# Altium schematic symbol library jlcpcb_2025_04_capacitors_extended_1206.schlib: 2503 symbols (part 2 of 14) (continued)
## 1206B334K101CT
designator C?  Capacitance: 330nF  (hidden comment: *)
Capacitor, Ceramic (MLCC), 330nF, ±10%, 100V, X7R, ±10%, SMD 1206; Manufacturer: Walsin Tech Corp; Manufacturer Part Number: 1206B334K101CT; Package Size: 1206; JLCPCB Basic Part: No; JLCPCB Part Number: C2909452; Supplier 1: LCSC; Category: Capacitors - MLCC; Supplier Part Number 1: C2909452; Tolerance: ±10%; Voltage Rating: 100V; Temperature Coefficient: X7R; RoHS: Yes; ComponentLink1Description: Datasheet; ComponentLink1URL: https://wmsc.lcsc.com/wmsc/upload/file/pdf/v2/lcsc/2110272130_Walsin-Tech-Corp-1206B334K101CT_C2909452.pdf; ComponentLink2Description: JLCPCB Part URL; ComponentLink2URL: https://jlcpcb.com/partdetail/C2909452; ComponentLink3Description: LCSC Part URL; ComponentLink3URL: https://lcsc.com/product-detail/Multilayer-Ceramic-Capacitors-MLCC---SMD-SMT_Walsin-Tech-Corp-Walsin-Tech-Corp-1206B334K101CT_C2909452.html
footprint CAP-1206 (1206 (3216M) Capacitor)
pins: 1, 2

## 1206B334K250CT
designator C?  Capacitance: 330nF  (hidden comment: *)
Capacitor, Ceramic (MLCC), 330nF, ±10%, 25V, X7R, ±10%, SMD 1206; Manufacturer: Walsin Tech Corp; Manufacturer Part Number: 1206B334K250CT; Package Size: 1206; JLCPCB Basic Part: No; JLCPCB Part Number: C458939; Supplier 1: LCSC; Category: Capacitors - MLCC; Supplier Part Number 1: C458939; Tolerance: ±10%; Voltage Rating: 25V; Temperature Coefficient: X7R; RoHS: Yes; ComponentLink1Description: Datasheet; ComponentLink1URL: https://wmsc.lcsc.com/wmsc/upload/file/pdf/v2/lcsc/2304140030_Walsin-Tech-Corp-1206B334K250CT_C458939.pdf; ComponentLink2Description: JLCPCB Part URL; ComponentLink2URL: https://jlcpcb.com/partdetail/C458939; ComponentLink3Description: LCSC Part URL; ComponentLink3URL: https://lcsc.com/product-detail/Multilayer-Ceramic-Capacitors-MLCC---SMD-SMT_Walsin-Tech-Corp-Walsin-Tech-Corp-1206B334K250CT_C458939.html
footprint CAP-1206 (1206 (3216M) Capacitor)
pins: 1, 2

## 1206B334K250NT
designator C?  Capacitance: 330nF  (hidden comment: *)
Capacitor, Ceramic (MLCC), 330nF, 25V, SMD 1206; Manufacturer: FH(Guangdong Fenghua Advanced Tech); Manufacturer Part Number: 1206B334K250NT; Package Size: 1206; JLCPCB Basic Part: No; JLCPCB Part Number: C2762228; Supplier 1: LCSC; Category: Capacitors - MLCC; Supplier Part Number 1: C2762228; Voltage Rating: 25V; RoHS: Yes; ComponentLink1Description: Datasheet; ComponentLink1URL: https://wmsc.lcsc.com/wmsc/upload/file/pdf/v2/lcsc/2304140030_FH--Guangdong-Fenghua-Advanced-Tech-1206B334K250NT_C2762228.pdf; ComponentLink2Description: JLCPCB Part URL; ComponentLink2URL: https://jlcpcb.com/partdetail/C2762228; ComponentLink3Description: LCSC Part URL; ComponentLink3URL: https://lcsc.com/product-detail/Multilayer-Ceramic-Capacitors-MLCC---SMD-SMT_FH-Guangdong-Fenghua-Advanced-Tech-FH-Guangdong-Fenghua-Advanced-Tech-1206B334K250NT_C2762228.html
footprint CAP-1206 (1206 (3216M) Capacitor)
pins: 1, 2

## 1206B334K500CT
designator C?  Capacitance: 330nF  (hidden comment: *)
Capacitor, Ceramic (MLCC), 330nF, ±10%, 50V, X7R, ±10%, SMD 1206; Manufacturer: Walsin Tech Corp; Manufacturer Part Number: 1206B334K500CT; Package Size: 1206; JLCPCB Basic Part: No; JLCPCB Part Number: C152830; Supplier 1: LCSC; Category: Capacitors - MLCC; Supplier Part Number 1: C152830; Tolerance: ±10%; Voltage Rating: 50V; Temperature Coefficient: X7R; RoHS: Yes; ComponentLink1Description: Datasheet; ComponentLink1URL: https://wmsc.lcsc.com/wmsc/upload/file/pdf/v2/lcsc/2304140030_Walsin-Tech-Corp-1206B334K500CT_C152830.pdf; ComponentLink2Description: JLCPCB Part URL; ComponentLink2URL: https://jlcpcb.com/partdetail/C152830; ComponentLink3Description: LCSC Part URL; ComponentLink3URL: https://lcsc.com/product-detail/Multilayer-Ceramic-Capacitors-MLCC---SMD-SMT_Walsin-Tech-Corp-Walsin-Tech-Corp-1206B334K500CT_C152830.html
footprint CAP-1206 (1206 (3216M) Capacitor)
pins: 1, 2

## 1206B334K500NT
designator C?  Capacitance: 330nF  (hidden comment: *)
Capacitor, Ceramic (MLCC), 330nF, ±10%, 50V, X7R, ±10%, SMD 1206; Manufacturer: FH(Guangdong Fenghua Advanced Tech); Manufacturer Part Number: 1206B334K500NT; Package Size: 1206; JLCPCB Basic Part: No; JLCPCB Part Number: C1865; Supplier 1: LCSC; Category: Capacitors - MLCC; Supplier Part Number 1: C1865; Tolerance: ±10%; Voltage Rating: 50V; Temperature Coefficient: X7R; RoHS: Yes; ComponentLink1Description: Datasheet; ComponentLink1URL: https://wmsc.lcsc.com/wmsc/upload/file/pdf/v2/lcsc/2304140030_FH--Guangdong-Fenghua-Advanced-Tech-1206B334K500NT_C1865.pdf; ComponentLink2Description: JLCPCB Part URL; ComponentLink2URL: https://jlcpcb.com/partdetail/C1865; ComponentLink3Description: LCSC Part URL; ComponentLink3URL: https://lcsc.com/product-detail/Multilayer-Ceramic-Capacitors-MLCC---SMD-SMT_FH-Guangdong-Fenghua-Advanced-Tech-FH-Guangdong-Fenghua-Advanced-Tech-1206B334K500NT_C1865.html
footprint CAP-1206 (1206 (3216M) Capacitor)
pins: 1, 2

## 1206B335K250CT
designator C?  Capacitance: 3.3uF  (hidden comment: *)
Capacitor, Ceramic (MLCC), 3.3uF, ±10%, 25V, X7R, ±10%, SMD 1206; Manufacturer: Walsin Tech Corp; Manufacturer Part Number: 1206B335K250CT; Package Size: 1206; JLCPCB Basic Part: No; JLCPCB Part Number: C3894461; Supplier 1: LCSC; Category: Capacitors - MLCC; Supplier Part Number 1: C3894461; Tolerance: ±10%; Voltage Rating: 25V; Temperature Coefficient: X7R; RoHS: Yes; ComponentLink1Description: Datasheet; ComponentLink1URL: https://wmsc.lcsc.com/wmsc/upload/file/pdf/v2/lcsc/2401181627_Walsin-Tech-Corp-1206B335K250CT_C3894461.pdf; ComponentLink2Description: JLCPCB Part URL; ComponentLink2URL: https://jlcpcb.com/partdetail/C3894461; ComponentLink3Description: LCSC Part URL; ComponentLink3URL: https://lcsc.com/product-detail/Multilayer-Ceramic-Capacitors-MLCC---SMD-SMT_Walsin-Tech-Corp-Walsin-Tech-Corp-1206B335K250CT_C3894461.html
footprint CAP-1206 (1206 (3216M) Capacitor)
pins: 1, 2

## 1206B335K250NT
designator C?  Capacitance: 3.3uF  (hidden comment: *)
Capacitor, Ceramic (MLCC), 3.3uF, ±10%, 25V, ±10%, SMD 1206; Manufacturer: FH(Guangdong Fenghua Advanced Tech); Manufacturer Part Number: 1206B335K250NT; Package Size: 1206; JLCPCB Basic Part: No; JLCPCB Part Number: C1322386; Supplier 1: LCSC; Category: Capacitors - MLCC; Supplier Part Number 1: C1322386; Tolerance: ±10%; Voltage Rating: 25V; RoHS: Yes; ComponentLink1Description: Datasheet; ComponentLink1URL: https://wmsc.lcsc.com/wmsc/upload/file/pdf/v2/lcsc/2304140030_FH--Guangdong-Fenghua-Advanced-Tech-1206B335K250NT_C1322386.pdf; ComponentLink2Description: JLCPCB Part URL; ComponentLink2URL: https://jlcpcb.com/partdetail/C1322386; ComponentLink3Description: LCSC Part URL; ComponentLink3URL: https://lcsc.com/product-detail/Multilayer-Ceramic-Capacitors-MLCC---SMD-SMT_FH-Guangdong-Fenghua-Advanced-Tech-FH-Guangdong-Fenghua-Advanced-Tech-1206B335K250NT_C1322386.html
footprint CAP-1206 (1206 (3216M) Capacitor)
pins: 1, 2

## 1206B391K102CT
designator C?  Capacitance: 390pF  (hidden comment: *)
Capacitor, Ceramic (MLCC), 390pF, ±10%, 1kV, X7R, ±10%, SMD 1206; Manufacturer: Walsin Tech Corp; Manufacturer Part Number: 1206B391K102CT; Package Size: 1206; JLCPCB Basic Part: No; JLCPCB Part Number: C303959; Supplier 1: LCSC; Category: Capacitors - MLCC; Supplier Part Number 1: C303959; Tolerance: ±10%; Voltage Rating: 1kV; Temperature Coefficient: X7R; RoHS: Yes; ComponentLink1Description: Datasheet; ComponentLink1URL: https://wmsc.lcsc.com/wmsc/upload/file/pdf/v2/lcsc/2304231850_Walsin-Tech-Corp-1206B391K102CT_C303959.pdf; ComponentLink2Description: JLCPCB Part URL; ComponentLink2URL: https://jlcpcb.com/partdetail/C303959; ComponentLink3Description: LCSC Part URL; ComponentLink3URL: https://lcsc.com/product-detail/Multilayer-Ceramic-Capacitors-MLCC---SMD-SMT_Walsin-Tech-Corp-Walsin-Tech-Corp-1206B391K102CT_C303959.html
footprint CAP-1206 (1206 (3216M) Capacitor)
pins: 1, 2

## 1206B391K102NT
designator C?  Capacitance: 390pF  (hidden comment: *)
Capacitor, Ceramic (MLCC), 390pF, ±10%, 1kV, X7R, ±10%, SMD 1206; Manufacturer: FH(Guangdong Fenghua Advanced Tech); Manufacturer Part Number: 1206B391K102NT; Package Size: 1206; JLCPCB Basic Part: No; JLCPCB Part Number: C49016; Supplier 1: LCSC; Category: Capacitors - MLCC; Supplier Part Number 1: C49016; Tolerance: ±10%; Voltage Rating: 1kV; Temperature Coefficient: X7R; RoHS: Yes; ComponentLink1Description: Datasheet; ComponentLink1URL: https://wmsc.lcsc.com/wmsc/upload/file/pdf/v2/lcsc/2304140030_FH--Guangdong-Fenghua-Advanced-Tech-1206B391K102NT_C49016.pdf; ComponentLink2Description: JLCPCB Part URL; ComponentLink2URL: https://jlcpcb.com/partdetail/C49016; ComponentLink3Description: LCSC Part URL; ComponentLink3URL: https://lcsc.com/product-detail/Multilayer-Ceramic-Capacitors-MLCC---SMD-SMT_FH-Guangdong-Fenghua-Advanced-Tech-FH-Guangdong-Fenghua-Advanced-Tech-1206B391K102NT_C49016.html
footprint CAP-1206 (1206 (3216M) Capacitor)
pins: 1, 2

## 1206B391K500NT
designator C?  Capacitance: 390pF  (hidden comment: *)
Capacitor, Ceramic (MLCC), 390pF, ±10%, 50V, X7R, ±10%, SMD 1206; Manufacturer: FH(Guangdong Fenghua Advanced Tech); Manufacturer Part Number: 1206B391K500NT; Package Size: 1206; JLCPCB Basic Part: No; JLCPCB Part Number: C1866; Supplier 1: LCSC; Category: Capacitors - MLCC; Supplier Part Number 1: C1866; Tolerance: ±10%; Voltage Rating: 50V; Temperature Coefficient: X7R; RoHS: Yes; ComponentLink1Description: Datasheet; ComponentLink1URL: https://wmsc.lcsc.com/wmsc/upload/file/pdf/v2/lcsc/2304140030_FH--Guangdong-Fenghua-Advanced-Tech-1206B391K500NT_C1866.pdf; ComponentLink2Description: JLCPCB Part URL; ComponentLink2URL: https://jlcpcb.com/partdetail/C1866; ComponentLink3Description: LCSC Part URL; ComponentLink3URL: https://lcsc.com/product-detail/Multilayer-Ceramic-Capacitors-MLCC---SMD-SMT_FH-Guangdong-Fenghua-Advanced-Tech-FH-Guangdong-Fenghua-Advanced-Tech-1206B391K500NT_C1866.html
footprint CAP-1206 (1206 (3216M) Capacitor)
pins: 1, 2

## 1206B392K500NT
designator C?  Capacitance: 3.9nF  (hidden comment: *)
Capacitor, Ceramic (MLCC), 3.9nF, ±10%, 50V, X7R, ±10%, SMD 1206; Manufacturer: FH(Guangdong Fenghua Advanced Tech); Manufacturer Part Number: 1206B392K500NT; Package Size: 1206; JLCPCB Basic Part: No; JLCPCB Part Number: C1867; Supplier 1: LCSC; Category: Capacitors - MLCC; Supplier Part Number 1: C1867; Tolerance: ±10%; Voltage Rating: 50V; Temperature Coefficient: X7R; RoHS: Yes; ComponentLink1Description: Datasheet; ComponentLink1URL: https://wmsc.lcsc.com/wmsc/upload/file/pdf/v2/lcsc/2304140030_FH--Guangdong-Fenghua-Advanced-Tech-1206B392K500NT_C1867.pdf; ComponentLink2Description: JLCPCB Part URL; ComponentLink2URL: https://jlcpcb.com/partdetail/C1867; ComponentLink3Description: LCSC Part URL; ComponentLink3URL: https://lcsc.com/product-detail/Multilayer-Ceramic-Capacitors-MLCC---SMD-SMT_FH-Guangdong-Fenghua-Advanced-Tech-FH-Guangdong-Fenghua-Advanced-Tech-1206B392K500NT_C1867.html
footprint CAP-1206 (1206 (3216M) Capacitor)
pins: 1, 2

## 1206B471K101CT
designator C?  Capacitance: 470pF  (hidden comment: *)
Capacitor, Ceramic (MLCC), 470pF, ±10%, 100V, X7R, ±10%, SMD 1206; Manufacturer: Walsin Tech Corp; Manufacturer Part Number: 1206B471K101CT; Package Size: 1206; JLCPCB Basic Part: No; JLCPCB Part Number: C152961; Supplier 1: LCSC; Category: Capacitors - MLCC; Supplier Part Number 1: C152961; Tolerance: ±10%; Voltage Rating: 100V; Temperature Coefficient: X7R; RoHS: Yes; ComponentLink1Description: Datasheet; ComponentLink1URL: https://wmsc.lcsc.com/wmsc/upload/file/pdf/v2/lcsc/2304140030_Walsin-Tech-Corp-1206B471K101CT_C152961.pdf; ComponentLink2Description: JLCPCB Part URL; ComponentLink2URL: https://jlcpcb.com/partdetail/C152961; ComponentLink3Description: LCSC Part URL; ComponentLink3URL: https://lcsc.com/product-detail/Multilayer-Ceramic-Capacitors-MLCC---SMD-SMT_Walsin-Tech-Corp-Walsin-Tech-Corp-1206B471K101CT_C152961.html
footprint CAP-1206 (1206 (3216M) Capacitor)
pins: 1, 2

## 1206B471K101NT
designator C?  Capacitance: 470pF  (hidden comment: *)
Capacitor, Ceramic (MLCC), 470pF, ±10%, 100V, X7R, ±10%, SMD 1206; Manufacturer: FH(Guangdong Fenghua Advanced Tech); Manufacturer Part Number: 1206B471K101NT; Package Size: 1206; JLCPCB Basic Part: No; JLCPCB Part Number: C43541; Supplier 1: LCSC; Category: Capacitors - MLCC; Supplier Part Number 1: C43541; Tolerance: ±10%; Voltage Rating: 100V; Temperature Coefficient: X7R; RoHS: Yes; ComponentLink1Description: Datasheet; ComponentLink1URL: https://wmsc.lcsc.com/wmsc/upload/file/pdf/v2/lcsc/2304140030_FH--Guangdong-Fenghua-Advanced-Tech-1206B471K101NT_C43541.pdf; ComponentLink2Description: JLCPCB Part URL; ComponentLink2URL: https://jlcpcb.com/partdetail/C43541; ComponentLink3Description: LCSC Part URL; ComponentLink3URL: https://lcsc.com/product-detail/Multilayer-Ceramic-Capacitors-MLCC---SMD-SMT_FH-Guangdong-Fenghua-Advanced-Tech-FH-Guangdong-Fenghua-Advanced-Tech-1206B471K101NT_C43541.html
footprint CAP-1206 (1206 (3216M) Capacitor)
pins: 1, 2

## 1206B471K102CT
designator C?  Capacitance: 470pF  (hidden comment: *)
Capacitor, Ceramic (MLCC), 470pF, ±10%, 1kV, X7R, ±10%, SMD 1206; Manufacturer: Walsin Tech Corp; Manufacturer Part Number: 1206B471K102CT; Package Size: 1206; JLCPCB Basic Part: No; JLCPCB Part Number: C77517; Supplier 1: LCSC; Category: Capacitors - MLCC; Supplier Part Number 1: C77517; Tolerance: ±10%; Voltage Rating: 1kV; Temperature Coefficient: X7R; RoHS: Yes; ComponentLink1Description: Datasheet; ComponentLink2Description: JLCPCB Part URL; ComponentLink2URL: https://jlcpcb.com/partdetail/C77517; ComponentLink3Description: LCSC Part URL; ComponentLink3URL: https://lcsc.com/product-detail/Multilayer-Ceramic-Capacitors-MLCC---SMD-SMT_Walsin-Tech-Corp-Walsin-Tech-Corp-1206B471K102CT_C77517.html
footprint CAP-1206 (1206 (3216M) Capacitor)
pins: 1, 2

## 1206B471K102NT_C9189
designator C?  Capacitance: 470pF  (hidden comment: *)
Capacitor, Ceramic (MLCC), 470pF, ±10%, 1kV, X7R, ±10%, SMD 1206; Manufacturer: FH(Guangdong Fenghua Advanced Tech); Manufacturer Part Number: 1206B471K102NT; Package Size: 1206; JLCPCB Basic Part: No; JLCPCB Part Number: C9189; Supplier 1: LCSC; Category: Capacitors - MLCC; Supplier Part Number 1: C9189; Tolerance: ±10%; Voltage Rating: 1kV; Temperature Coefficient: X7R; RoHS: Yes; ComponentLink1Description: Datasheet; ComponentLink1URL: https://wmsc.lcsc.com/wmsc/upload/file/pdf/v2/lcsc/2304140030_FH--Guangdong-Fenghua-Advanced-Tech-1206B471K102NT_C9189.pdf; ComponentLink2Description: JLCPCB Part URL; ComponentLink2URL: https://jlcpcb.com/partdetail/C9189; ComponentLink3Description: LCSC Part URL; ComponentLink3URL: https://lcsc.com/product-detail/Multilayer-Ceramic-Capacitors-MLCC---SMD-SMT_FH-Guangdong-Fenghua-Advanced-Tech-FH-Guangdong-Fenghua-Advanced-Tech-1206B471K102NT_C9189.html
footprint CAP-1206 (1206 (3216M) Capacitor)
pins: 1, 2

## 1206B471K102NT_C2839025
designator C?  Capacitance: 470pF  (hidden comment: *)
Capacitor, Ceramic (MLCC), 470pF, ±10%, 1kV, ±10%, SMD 1206; Manufacturer: FH-BK(Guangdong Fenghua Bangke Elec); Manufacturer Part Number: 1206B471K102NT; Package Size: 1206; JLCPCB Basic Part: No; JLCPCB Part Number: C2839025; Supplier 1: LCSC; Category: Capacitors - MLCC; Supplier Part Number 1: C2839025; Tolerance: ±10%; Voltage Rating: 1kV; RoHS: Yes; ComponentLink1Description: Datasheet; ComponentLink1URL: https://wmsc.lcsc.com/wmsc/upload/file/pdf/v2/lcsc/2202132000_FH-BK-Guangdong-Fenghua-Bangke-Elec-1206B471K102NT_C2839025.pdf; ComponentLink2Description: JLCPCB Part URL; ComponentLink2URL: https://jlcpcb.com/partdetail/C2839025; ComponentLink3Description: LCSC Part URL; ComponentLink3URL: https://lcsc.com/product-detail/Multilayer-Ceramic-Capacitors-MLCC---SMD-SMT_FH-BKGuangdong-Fenghua-Bangke-Elec-FH-BKGuangdong-Fenghua-Bangke-Elec-1206B471K102NT_C2839025.html
footprint CAP-1206 (1206 (3216M) Capacitor)
pins: 1, 2

## 1206B471K201CT
designator C?  Capacitance: 470pF  (hidden comment: *)
Capacitor, Ceramic (MLCC), 470pF, ±10%, 200V, X7R, ±10%, SMD 1206; Manufacturer: Walsin Tech Corp; Manufacturer Part Number: 1206B471K201CT; Package Size: 1206; JLCPCB Basic Part: No; JLCPCB Part Number: C237219; Supplier 1: LCSC; Category: Capacitors - MLCC; Supplier Part Number 1: C237219; Tolerance: ±10%; Voltage Rating: 200V; Temperature Coefficient: X7R; RoHS: Yes; ComponentLink1Description: Datasheet; ComponentLink1URL: https://wmsc.lcsc.com/wmsc/upload/file/pdf/v2/lcsc/2304140030_Walsin-Tech-Corp-1206B471K201CT_C237219.pdf; ComponentLink2Description: JLCPCB Part URL; ComponentLink2URL: https://jlcpcb.com/partdetail/C237219; ComponentLink3Description: LCSC Part URL; ComponentLink3URL: https://lcsc.com/product-detail/Multilayer-Ceramic-Capacitors-MLCC---SMD-SMT_Walsin-Tech-Corp-Walsin-Tech-Corp-1206B471K201CT_C237219.html
footprint CAP-1206 (1206 (3216M) Capacitor)
pins: 1, 2

## 1206B471K202CT
designator C?  Capacitance: 470pF  (hidden comment: *)
Capacitor, Ceramic (MLCC), 470pF, ±10%, 2kV, X7R, ±10%, SMD 1206; Manufacturer: Walsin Tech Corp; Manufacturer Part Number: 1206B471K202CT; Package Size: 1206; JLCPCB Basic Part: No; JLCPCB Part Number: C152960; Supplier 1: LCSC; Category: Capacitors - MLCC; Supplier Part Number 1: C152960; Tolerance: ±10%; Voltage Rating: 2kV; Temperature Coefficient: X7R; RoHS: Yes; ComponentLink1Description: Datasheet; ComponentLink2Description: JLCPCB Part URL; ComponentLink2URL: https://jlcpcb.com/partdetail/C152960; ComponentLink3Description: LCSC Part URL; ComponentLink3URL: https://lcsc.com/product-detail/Multilayer-Ceramic-Capacitors-MLCC---SMD-SMT_Walsin-Tech-Corp-Walsin-Tech-Corp-1206B471K202CT_C152960.html
footprint CAP-1206 (1206 (3216M) Capacitor)
pins: 1, 2

## 1206B471K202NT_C52287
designator C?  Capacitance: 470pF  (hidden comment: *)
Capacitor, Ceramic (MLCC), 470pF, ±10%, 2kV, X7R, ±10%, SMD 1206; Manufacturer: FH(Guangdong Fenghua Advanced Tech); Manufacturer Part Number: 1206B471K202NT; Package Size: 1206; JLCPCB Basic Part: No; JLCPCB Part Number: C52287; Supplier 1: LCSC; Category: Capacitors - MLCC; Supplier Part Number 1: C52287; Tolerance: ±10%; Voltage Rating: 2kV; Temperature Coefficient: X7R; RoHS: Yes; ComponentLink1Description: Datasheet; ComponentLink1URL: https://wmsc.lcsc.com/wmsc/upload/file/pdf/v2/lcsc/2304140030_FH--Guangdong-Fenghua-Advanced-Tech-1206B471K202NT_C52287.pdf; ComponentLink2Description: JLCPCB Part URL; ComponentLink2URL: https://jlcpcb.com/partdetail/C52287; ComponentLink3Description: LCSC Part URL; ComponentLink3URL: https://lcsc.com/product-detail/Multilayer-Ceramic-Capacitors-MLCC---SMD-SMT_FH-Guangdong-Fenghua-Advanced-Tech-FH-Guangdong-Fenghua-Advanced-Tech-1206B471K202NT_C52287.html
footprint CAP-1206 (1206 (3216M) Capacitor)
pins: 1, 2

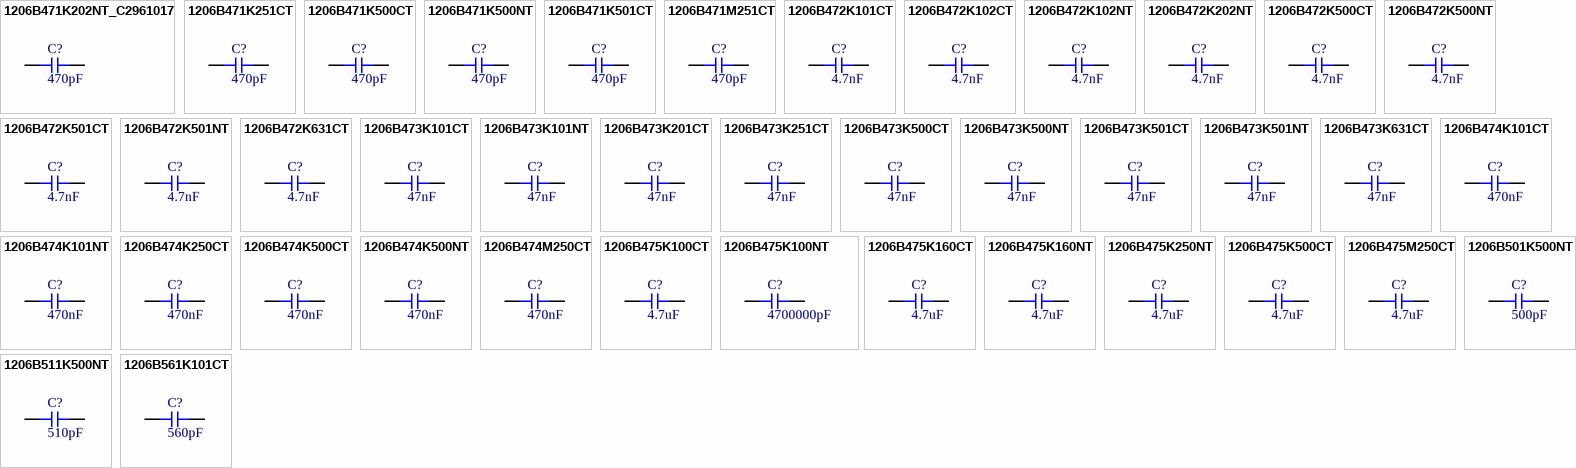
[diagram p6: symbols 1206B471K202NT_C2961017 to 1206B561K101CT]

## 1206B471K202NT_C2961017
designator C?  Capacitance: 470pF  (hidden comment: *)
Capacitor, Ceramic (MLCC), 470pF, ±10%, 2kV, X7R, ±10%, SMD 1206; Manufacturer: FH-BK(Guangdong Fenghua Bangke Elec); Manufacturer Part Number: 1206B471K202NT; Package Size: 1206; JLCPCB Basic Part: No; JLCPCB Part Number: C2961017; Supplier 1: LCSC; Category: Capacitors - MLCC; Supplier Part Number 1: C2961017; Tolerance: ±10%; Voltage Rating: 2kV; Temperature Coefficient: X7R; RoHS: Yes; ComponentLink1Description: Datasheet; ComponentLink1URL: https://wmsc.lcsc.com/wmsc/upload/file/pdf/v2/lcsc/2201191030_FH-BK-Guangdong-Fenghua-Bangke-Elec-1206B471K202NT_C2961017.pdf; ComponentLink2Description: JLCPCB Part URL; ComponentLink2URL: https://jlcpcb.com/partdetail/C2961017; ComponentLink3Description: LCSC Part URL; ComponentLink3URL: https://lcsc.com/product-detail/Multilayer-Ceramic-Capacitors-MLCC---SMD-SMT_FH-BKGuangdong-Fenghua-Bangke-Elec-FH-BKGuangdong-Fenghua-Bangke-Elec-1206B471K202NT_C2961017.html
footprint CAP-1206 (1206 (3216M) Capacitor)
pins: 1, 2

## 1206B471K251CT
designator C?  Capacitance: 470pF  (hidden comment: *)
Capacitor, Ceramic (MLCC), 470pF, ±10%, 250V, X7R, ±10%, SMD 1206; Manufacturer: Walsin Tech Corp; Manufacturer Part Number: 1206B471K251CT; Package Size: 1206; JLCPCB Basic Part: No; JLCPCB Part Number: C77518; Supplier 1: LCSC; Category: Capacitors - MLCC; Supplier Part Number 1: C77518; Tolerance: ±10%; Voltage Rating: 250V; Temperature Coefficient: X7R; RoHS: Yes; ComponentLink1Description: Datasheet; ComponentLink1URL: https://wmsc.lcsc.com/wmsc/upload/file/pdf/v2/lcsc/2304140030_Walsin-Tech-Corp-1206B471K251CT_C77518.pdf; ComponentLink2Description: JLCPCB Part URL; ComponentLink2URL: https://jlcpcb.com/partdetail/C77518; ComponentLink3Description: LCSC Part URL; ComponentLink3URL: https://lcsc.com/product-detail/Multilayer-Ceramic-Capacitors-MLCC---SMD-SMT_Walsin-Tech-Corp-Walsin-Tech-Corp-1206B471K251CT_C77518.html
footprint CAP-1206 (1206 (3216M) Capacitor)
pins: 1, 2

## 1206B471K500CT
designator C?  Capacitance: 470pF  (hidden comment: *)
Capacitor, Ceramic (MLCC), 470pF, ±10%, 50V, X7R, ±10%, SMD 1206; Manufacturer: Walsin Tech Corp; Manufacturer Part Number: 1206B471K500CT; Package Size: 1206; JLCPCB Basic Part: No; JLCPCB Part Number: C237220; Supplier 1: LCSC; Category: Capacitors - MLCC; Supplier Part Number 1: C237220; Tolerance: ±10%; Voltage Rating: 50V; Temperature Coefficient: X7R; RoHS: Yes; ComponentLink1Description: Datasheet; ComponentLink1URL: https://wmsc.lcsc.com/wmsc/upload/file/pdf/v2/lcsc/2304140030_Walsin-Tech-Corp-1206B471K500CT_C237220.pdf; ComponentLink2Description: JLCPCB Part URL; ComponentLink2URL: https://jlcpcb.com/partdetail/C237220; ComponentLink3Description: LCSC Part URL; ComponentLink3URL: https://lcsc.com/product-detail/Multilayer-Ceramic-Capacitors-MLCC---SMD-SMT_Walsin-Tech-Corp-Walsin-Tech-Corp-1206B471K500CT_C237220.html
footprint CAP-1206 (1206 (3216M) Capacitor)
pins: 1, 2

## 1206B471K500NT
designator C?  Capacitance: 470pF  (hidden comment: *)
Capacitor, Ceramic (MLCC), 470pF, ±10%, 50V, X7R, ±10%, SMD 1206; Manufacturer: FH(Guangdong Fenghua Advanced Tech); Manufacturer Part Number: 1206B471K500NT; Package Size: 1206; JLCPCB Basic Part: No; JLCPCB Part Number: C1868; Supplier 1: LCSC; Category: Capacitors - MLCC; Supplier Part Number 1: C1868; Tolerance: ±10%; Voltage Rating: 50V; Temperature Coefficient: X7R; RoHS: Yes; ComponentLink1Description: Datasheet; ComponentLink1URL: https://wmsc.lcsc.com/wmsc/upload/file/pdf/v2/lcsc/2304140030_FH--Guangdong-Fenghua-Advanced-Tech-1206B471K500NT_C1868.pdf; ComponentLink2Description: JLCPCB Part URL; ComponentLink2URL: https://jlcpcb.com/partdetail/C1868; ComponentLink3Description: LCSC Part URL; ComponentLink3URL: https://lcsc.com/product-detail/Multilayer-Ceramic-Capacitors-MLCC---SMD-SMT_FH-Guangdong-Fenghua-Advanced-Tech-FH-Guangdong-Fenghua-Advanced-Tech-1206B471K500NT_C1868.html
footprint CAP-1206 (1206 (3216M) Capacitor)
pins: 1, 2

## 1206B471K501CT
designator C?  Capacitance: 470pF  (hidden comment: *)
Capacitor, Ceramic (MLCC), 470pF, ±10%, 500V, X7R, ±10%, SMD 1206; Manufacturer: Walsin Tech Corp; Manufacturer Part Number: 1206B471K501CT; Package Size: 1206; JLCPCB Basic Part: No; JLCPCB Part Number: C575466; Supplier 1: LCSC; Category: Capacitors - MLCC; Supplier Part Number 1: C575466; Tolerance: ±10%; Voltage Rating: 500V; Temperature Coefficient: X7R; RoHS: Yes; ComponentLink1Description: Datasheet; ComponentLink1URL: https://wmsc.lcsc.com/wmsc/upload/file/pdf/v2/lcsc/2304140030_Walsin-Tech-Corp-1206B471K501CT_C575466.pdf; ComponentLink2Description: JLCPCB Part URL; ComponentLink2URL: https://jlcpcb.com/partdetail/C575466; ComponentLink3Description: LCSC Part URL; ComponentLink3URL: https://lcsc.com/product-detail/Multilayer-Ceramic-Capacitors-MLCC---SMD-SMT_Walsin-Tech-Corp-Walsin-Tech-Corp-1206B471K501CT_C575466.html
footprint CAP-1206 (1206 (3216M) Capacitor)
pins: 1, 2

## 1206B471M251CT
designator C?  Capacitance: 470pF  (hidden comment: *)
Capacitor, Ceramic (MLCC), 470pF, ±20%, 250V, X7R, ±20%, SMD 1206; Manufacturer: Walsin Tech Corp; Manufacturer Part Number: 1206B471M251CT; Package Size: 1206; JLCPCB Basic Part: No; JLCPCB Part Number: C384735; Supplier 1: LCSC; Category: Capacitors - MLCC; Supplier Part Number 1: C384735; Tolerance: ±20%; Voltage Rating: 250V; Temperature Coefficient: X7R; RoHS: Yes; ComponentLink1Description: Datasheet; ComponentLink1URL: https://wmsc.lcsc.com/wmsc/upload/file/pdf/v2/lcsc/2304140030_Walsin-Tech-Corp-1206B471M251CT_C384735.pdf; ComponentLink2Description: JLCPCB Part URL; ComponentLink2URL: https://jlcpcb.com/partdetail/C384735; ComponentLink3Description: LCSC Part URL; ComponentLink3URL: https://lcsc.com/product-detail/Multilayer-Ceramic-Capacitors-MLCC---SMD-SMT_Walsin-Tech-Corp-Walsin-Tech-Corp-1206B471M251CT_C384735.html
footprint CAP-1206 (1206 (3216M) Capacitor)
pins: 1, 2

## 1206B472K101CT
designator C?  Capacitance: 4.7nF  (hidden comment: *)
Capacitor, Ceramic (MLCC), 4.7nF, ±10%, 100V, X7R, ±10%, SMD 1206; Manufacturer: Walsin Tech Corp; Manufacturer Part Number: 1206B472K101CT; Package Size: 1206; JLCPCB Basic Part: No; JLCPCB Part Number: C384734; Supplier 1: LCSC; Category: Capacitors - MLCC; Supplier Part Number 1: C384734; Tolerance: ±10%; Voltage Rating: 100V; Temperature Coefficient: X7R; RoHS: Yes; ComponentLink1Description: Datasheet; ComponentLink1URL: https://wmsc.lcsc.com/wmsc/upload/file/pdf/v2/lcsc/2304140030_Walsin-Tech-Corp-1206B472K101CT_C384734.pdf; ComponentLink2Description: JLCPCB Part URL; ComponentLink2URL: https://jlcpcb.com/partdetail/C384734; ComponentLink3Description: LCSC Part URL; ComponentLink3URL: https://lcsc.com/product-detail/Multilayer-Ceramic-Capacitors-MLCC---SMD-SMT_Walsin-Tech-Corp-Walsin-Tech-Corp-1206B472K101CT_C384734.html
footprint CAP-1206 (1206 (3216M) Capacitor)
pins: 1, 2

## 1206B472K102CT
designator C?  Capacitance: 4.7nF  (hidden comment: *)
Capacitor, Ceramic (MLCC), 4.7nF, ±10%, 1kV, X7R, ±10%, SMD 1206; Manufacturer: Walsin Tech Corp; Manufacturer Part Number: 1206B472K102CT; Package Size: 1206; JLCPCB Basic Part: No; JLCPCB Part Number: C303960; Supplier 1: LCSC; Category: Capacitors - MLCC; Supplier Part Number 1: C303960; Tolerance: ±10%; Voltage Rating: 1kV; Temperature Coefficient: X7R; RoHS: Yes; ComponentLink1Description: Datasheet; ComponentLink1URL: https://wmsc.lcsc.com/wmsc/upload/file/pdf/v2/lcsc/2304231850_Walsin-Tech-Corp-1206B472K102CT_C303960.pdf; ComponentLink2Description: JLCPCB Part URL; ComponentLink2URL: https://jlcpcb.com/partdetail/C303960; ComponentLink3Description: LCSC Part URL; ComponentLink3URL: https://lcsc.com/product-detail/Multilayer-Ceramic-Capacitors-MLCC---SMD-SMT_Walsin-Tech-Corp-Walsin-Tech-Corp-1206B472K102CT_C303960.html
footprint CAP-1206 (1206 (3216M) Capacitor)
pins: 1, 2

## 1206B472K102NT
designator C?  Capacitance: 4.7nF  (hidden comment: *)
Capacitor, Ceramic (MLCC), 4.7nF, ±10%, 1kV, X7R, ±10%, SMD 1206; Manufacturer: FH(Guangdong Fenghua Advanced Tech); Manufacturer Part Number: 1206B472K102NT; Package Size: 1206; JLCPCB Basic Part: No; JLCPCB Part Number: C9192; Supplier 1: LCSC; Category: Capacitors - MLCC; Supplier Part Number 1: C9192; Tolerance: ±10%; Voltage Rating: 1kV; Temperature Coefficient: X7R; RoHS: Yes; ComponentLink1Description: Datasheet; ComponentLink1URL: https://wmsc.lcsc.com/wmsc/upload/file/pdf/v2/lcsc/2304140030_FH--Guangdong-Fenghua-Advanced-Tech-1206B472K102NT_C9192.pdf; ComponentLink2Description: JLCPCB Part URL; ComponentLink2URL: https://jlcpcb.com/partdetail/C9192; ComponentLink3Description: LCSC Part URL; ComponentLink3URL: https://lcsc.com/product-detail/Multilayer-Ceramic-Capacitors-MLCC---SMD-SMT_FH-Guangdong-Fenghua-Advanced-Tech-FH-Guangdong-Fenghua-Advanced-Tech-1206B472K102NT_C9192.html
footprint CAP-1206 (1206 (3216M) Capacitor)
pins: 1, 2

## 1206B472K202NT
designator C?  Capacitance: 4.7nF  (hidden comment: *)
Capacitor, Ceramic (MLCC), 4.7nF, ±10%, 2kV, X7R, ±10%, SMD 1206; Manufacturer: FH(Guangdong Fenghua Advanced Tech); Manufacturer Part Number: 1206B472K202NT; Package Size: 1206; JLCPCB Basic Part: No; JLCPCB Part Number: C41017; Supplier 1: LCSC; Category: Capacitors - MLCC; Supplier Part Number 1: C41017; Tolerance: ±10%; Voltage Rating: 2kV; Temperature Coefficient: X7R; RoHS: Yes; ComponentLink1Description: Datasheet; ComponentLink1URL: https://wmsc.lcsc.com/wmsc/upload/file/pdf/v2/lcsc/2304140030_FH--Guangdong-Fenghua-Advanced-Tech-1206B472K202NT_C41017.pdf; ComponentLink2Description: JLCPCB Part URL; ComponentLink2URL: https://jlcpcb.com/partdetail/C41017; ComponentLink3Description: LCSC Part URL; ComponentLink3URL: https://lcsc.com/product-detail/Multilayer-Ceramic-Capacitors-MLCC---SMD-SMT_FH-Guangdong-Fenghua-Advanced-Tech-FH-Guangdong-Fenghua-Advanced-Tech-1206B472K202NT_C41017.html
footprint CAP-1206 (1206 (3216M) Capacitor)
pins: 1, 2

## 1206B472K500CT
designator C?  Capacitance: 4.7nF  (hidden comment: *)
Capacitor, Ceramic (MLCC), 4.7nF, ±10%, 50V, X7R, ±10%, SMD 1206; Manufacturer: Walsin Tech Corp; Manufacturer Part Number: 1206B472K500CT; Package Size: 1206; JLCPCB Basic Part: No; JLCPCB Part Number: C384733; Supplier 1: LCSC; Category: Capacitors - MLCC; Supplier Part Number 1: C384733; Tolerance: ±10%; Voltage Rating: 50V; Temperature Coefficient: X7R; RoHS: Yes; ComponentLink1Description: Datasheet; ComponentLink1URL: https://wmsc.lcsc.com/wmsc/upload/file/pdf/v2/lcsc/2304140030_Walsin-Tech-Corp-1206B472K500CT_C384733.pdf; ComponentLink2Description: JLCPCB Part URL; ComponentLink2URL: https://jlcpcb.com/partdetail/C384733; ComponentLink3Description: LCSC Part URL; ComponentLink3URL: https://lcsc.com/product-detail/Multilayer-Ceramic-Capacitors-MLCC---SMD-SMT_Walsin-Tech-Corp-Walsin-Tech-Corp-1206B472K500CT_C384733.html
footprint CAP-1206 (1206 (3216M) Capacitor)
pins: 1, 2

## 1206B472K500NT
designator C?  Capacitance: 4.7nF  (hidden comment: *)
Capacitor, Ceramic (MLCC), 4.7nF, ±10%, 50V, X7R, ±10%, SMD 1206; Manufacturer: FH (Guangdong Fenghua Advanced Tech); Manufacturer Part Number: 1206B472K500NT; Package Size: 1206; JLCPCB Basic Part: No; JLCPCB Part Number: C1869; Supplier 1: LCSC; Category: Capacitors - MLCC; Supplier Part Number 1: C1869; Tolerance: ±10%; Voltage Rating: 50V; Temperature Coefficient: X7R; RoHS: Yes; ComponentLink1Description: Datasheet; ComponentLink1URL: https://wmsc.lcsc.com/wmsc/upload/file/pdf/v2/lcsc/2304140030_FH--Guangdong-Fenghua-Advanced-Tech-1206B472K500NT_C1869.pdf; ComponentLink2Description: JLCPCB Part URL; ComponentLink2URL: https://jlcpcb.com/partdetail/C1869; ComponentLink3Description: LCSC Part URL; ComponentLink3URL: https://lcsc.com/product-detail/Multilayer-Ceramic-Capacitors-MLCC---SMD-SMT_FH-Guangdong-Fenghua-Advanced-Tech-FH-Guangdong-Fenghua-Advanced-Tech-1206B472K500NT_C1869.html
footprint CAP-1206 (1206 (3216M) Capacitor)
pins: 1, 2

## 1206B472K501CT
designator C?  Capacitance: 4.7nF  (hidden comment: *)
Capacitor, Ceramic (MLCC), 4.7nF, ±10%, 500V, X7R, ±10%, SMD 1206; Manufacturer: Walsin Tech Corp; Manufacturer Part Number: 1206B472K501CT; Package Size: 1206; JLCPCB Basic Part: No; JLCPCB Part Number: C396790; Supplier 1: LCSC; Category: Capacitors - MLCC; Supplier Part Number 1: C396790; Tolerance: ±10%; Voltage Rating: 500V; Temperature Coefficient: X7R; RoHS: Yes; ComponentLink1Description: Datasheet; ComponentLink1URL: https://wmsc.lcsc.com/wmsc/upload/file/pdf/v2/lcsc/2304140030_Walsin-Tech-Corp-1206B472K501CT_C396790.pdf; ComponentLink2Description: JLCPCB Part URL; ComponentLink2URL: https://jlcpcb.com/partdetail/C396790; ComponentLink3Description: LCSC Part URL; ComponentLink3URL: https://lcsc.com/product-detail/Multilayer-Ceramic-Capacitors-MLCC---SMD-SMT_Walsin-Tech-Corp-Walsin-Tech-Corp-1206B472K501CT_C396790.html
footprint CAP-1206 (1206 (3216M) Capacitor)
pins: 1, 2

## 1206B472K501NT
designator C?  Capacitance: 4.7nF  (hidden comment: *)
Capacitor, Ceramic (MLCC), 4.7nF, ±10%, 500V, X7R, ±10%, SMD 1206; Manufacturer: FH(Guangdong Fenghua Advanced Tech); Manufacturer Part Number: 1206B472K501NT; Package Size: 1206; JLCPCB Basic Part: No; JLCPCB Part Number: C30323; Supplier 1: LCSC; Category: Capacitors - MLCC; Supplier Part Number 1: C30323; Tolerance: ±10%; Voltage Rating: 500V; Temperature Coefficient: X7R; RoHS: Yes; ComponentLink1Description: Datasheet; ComponentLink1URL: https://wmsc.lcsc.com/wmsc/upload/file/pdf/v2/lcsc/2304140030_FH--Guangdong-Fenghua-Advanced-Tech-1206B472K501NT_C30323.pdf; ComponentLink2Description: JLCPCB Part URL; ComponentLink2URL: https://jlcpcb.com/partdetail/C30323; ComponentLink3Description: LCSC Part URL; ComponentLink3URL: https://lcsc.com/product-detail/Multilayer-Ceramic-Capacitors-MLCC---SMD-SMT_FH-Guangdong-Fenghua-Advanced-Tech-FH-Guangdong-Fenghua-Advanced-Tech-1206B472K501NT_C30323.html
footprint CAP-1206 (1206 (3216M) Capacitor)
pins: 1, 2

## 1206B472K631CT
designator C?  Capacitance: 4.7nF  (hidden comment: *)
Capacitor, Ceramic (MLCC), 4.7nF, ±10%, 630V, X7R, ±10%, SMD 1206; Manufacturer: Walsin Tech Corp; Manufacturer Part Number: 1206B472K631CT; Package Size: 1206; JLCPCB Basic Part: No; JLCPCB Part Number: C469646; Supplier 1: LCSC; Category: Capacitors - MLCC; Supplier Part Number 1: C469646; Tolerance: ±10%; Voltage Rating: 630V; Temperature Coefficient: X7R; RoHS: Yes; ComponentLink1Description: Datasheet; ComponentLink1URL: https://wmsc.lcsc.com/wmsc/upload/file/pdf/v2/lcsc/2304140030_Walsin-Tech-Corp-1206B472K631CT_C469646.pdf; ComponentLink2Description: JLCPCB Part URL; ComponentLink2URL: https://jlcpcb.com/partdetail/C469646; ComponentLink3Description: LCSC Part URL; ComponentLink3URL: https://lcsc.com/product-detail/Multilayer-Ceramic-Capacitors-MLCC---SMD-SMT_Walsin-Tech-Corp-Walsin-Tech-Corp-1206B472K631CT_C469646.html
footprint CAP-1206 (1206 (3216M) Capacitor)
pins: 1, 2

## 1206B473K101CT
designator C?  Capacitance: 47nF  (hidden comment: *)
Capacitor, Ceramic (MLCC), 47nF, ±10%, 100V, X7R, ±10%, SMD 1206; Manufacturer: Walsin Tech Corp; Manufacturer Part Number: 1206B473K101CT; Package Size: 1206; JLCPCB Basic Part: No; JLCPCB Part Number: C2909462; Supplier 1: LCSC; Category: Capacitors - MLCC; Supplier Part Number 1: C2909462; Tolerance: ±10%; Voltage Rating: 100V; Temperature Coefficient: X7R; RoHS: Yes; ComponentLink1Description: Datasheet; ComponentLink1URL: https://wmsc.lcsc.com/wmsc/upload/file/pdf/v2/lcsc/2111030930_Walsin-Tech-Corp-1206B473K101CT_C2909462.pdf; ComponentLink2Description: JLCPCB Part URL; ComponentLink2URL: https://jlcpcb.com/partdetail/C2909462; ComponentLink3Description: LCSC Part URL; ComponentLink3URL: https://lcsc.com/product-detail/Multilayer-Ceramic-Capacitors-MLCC---SMD-SMT_Walsin-Tech-Corp-Walsin-Tech-Corp-1206B473K101CT_C2909462.html
footprint CAP-1206 (1206 (3216M) Capacitor)
pins: 1, 2

## 1206B473K101NT
designator C?  Capacitance: 47nF  (hidden comment: *)
Capacitor, Ceramic (MLCC), 47nF, ±10%, 100V, X7R, ±10%, SMD 1206; Manufacturer: FH (Guangdong Fenghua Advanced Tech); Manufacturer Part Number: 1206B473K101NT; Package Size: 1206; JLCPCB Basic Part: No; JLCPCB Part Number: C2991558; Supplier 1: LCSC; Category: Capacitors - MLCC; Supplier Part Number 1: C2991558; Tolerance: ±10%; Voltage Rating: 100V; Temperature Coefficient: X7R; RoHS: Yes; ComponentLink1Description: Datasheet; ComponentLink1URL: https://wmsc.lcsc.com/wmsc/upload/file/pdf/v2/lcsc/2204111630_FH--Guangdong-Fenghua-Advanced-Tech-1206B473K101NT_C2991558.pdf; ComponentLink2Description: JLCPCB Part URL; ComponentLink2URL: https://jlcpcb.com/partdetail/C2991558; ComponentLink3Description: LCSC Part URL; ComponentLink3URL: https://lcsc.com/product-detail/Multilayer-Ceramic-Capacitors-MLCC---SMD-SMT_FH-Guangdong-Fenghua-Advanced-Tech-FH-Guangdong-Fenghua-Advanced-Tech-1206B473K101NT_C2991558.html
footprint CAP-1206 (1206 (3216M) Capacitor)
pins: 1, 2

## 1206B473K201CT
designator C?  Capacitance: 47nF  (hidden comment: *)
Capacitor, Ceramic (MLCC), 47nF, ±10%, 200V, X7R, ±10%, SMD 1206; Manufacturer: Walsin Tech Corp; Manufacturer Part Number: 1206B473K201CT; Package Size: 1206; JLCPCB Basic Part: No; JLCPCB Part Number: C3872189; Supplier 1: LCSC; Category: Capacitors - MLCC; Supplier Part Number 1: C3872189; Tolerance: ±10%; Voltage Rating: 200V; Temperature Coefficient: X7R; RoHS: Yes; ComponentLink1Description: Datasheet; ComponentLink1URL: https://wmsc.lcsc.com/wmsc/upload/file/pdf/v2/lcsc/2401181518_Walsin-Tech-Corp-1206B473K201CT_C3872189.pdf; ComponentLink2Description: JLCPCB Part URL; ComponentLink2URL: https://jlcpcb.com/partdetail/C3872189; ComponentLink3Description: LCSC Part URL; ComponentLink3URL: https://lcsc.com/product-detail/Multilayer-Ceramic-Capacitors-MLCC---SMD-SMT_Walsin-Tech-Corp-Walsin-Tech-Corp-1206B473K201CT_C3872189.html
footprint CAP-1206 (1206 (3216M) Capacitor)
pins: 1, 2

## 1206B473K251CT
designator C?  Capacitance: 47nF  (hidden comment: *)
Capacitor, Ceramic (MLCC), 47nF, ±10%, 250V, X7R, ±10%, SMD 1206; Manufacturer: Walsin Tech Corp; Manufacturer Part Number: 1206B473K251CT; Package Size: 1206; JLCPCB Basic Part: No; JLCPCB Part Number: C303961; Supplier 1: LCSC; Category: Capacitors - MLCC; Supplier Part Number 1: C303961; Tolerance: ±10%; Voltage Rating: 250V; Temperature Coefficient: X7R; RoHS: Yes; ComponentLink1Description: Datasheet; ComponentLink1URL: https://wmsc.lcsc.com/wmsc/upload/file/pdf/v2/lcsc/2304231850_Walsin-Tech-Corp-1206B473K251CT_C303961.pdf; ComponentLink2Description: JLCPCB Part URL; ComponentLink2URL: https://jlcpcb.com/partdetail/C303961; ComponentLink3Description: LCSC Part URL; ComponentLink3URL: https://lcsc.com/product-detail/Multilayer-Ceramic-Capacitors-MLCC---SMD-SMT_Walsin-Tech-Corp-Walsin-Tech-Corp-1206B473K251CT_C303961.html
footprint CAP-1206 (1206 (3216M) Capacitor)
pins: 1, 2

## 1206B473K500CT
designator C?  Capacitance: 47nF  (hidden comment: *)
Capacitor, Ceramic (MLCC), 47nF, ±10%, 50V, X7R, ±10%, SMD 1206; Manufacturer: Walsin Tech Corp; Manufacturer Part Number: 1206B473K500CT; Package Size: 1206; JLCPCB Basic Part: No; JLCPCB Part Number: C152829; Supplier 1: LCSC; Category: Capacitors - MLCC; Supplier Part Number 1: C152829; Tolerance: ±10%; Voltage Rating: 50V; Temperature Coefficient: X7R; RoHS: Yes; ComponentLink1Description: Datasheet; ComponentLink1URL: https://wmsc.lcsc.com/wmsc/upload/file/pdf/v2/lcsc/2304140030_Walsin-Tech-Corp-1206B473K500CT_C152829.pdf; ComponentLink2Description: JLCPCB Part URL; ComponentLink2URL: https://jlcpcb.com/partdetail/C152829; ComponentLink3Description: LCSC Part URL; ComponentLink3URL: https://lcsc.com/product-detail/Multilayer-Ceramic-Capacitors-MLCC---SMD-SMT_Walsin-Tech-Corp-Walsin-Tech-Corp-1206B473K500CT_C152829.html
footprint CAP-1206 (1206 (3216M) Capacitor)
pins: 1, 2

## 1206B473K500NT
designator C?  Capacitance: 47nF  (hidden comment: *)
Capacitor, Ceramic (MLCC), 47nF, ±10%, 50V, X7R, ±10%, SMD 1206; Manufacturer: FH(Guangdong Fenghua Advanced Tech); Manufacturer Part Number: 1206B473K500NT; Package Size: 1206; JLCPCB Basic Part: No; JLCPCB Part Number: C1870; Supplier 1: LCSC; Category: Capacitors - MLCC; Supplier Part Number 1: C1870; Tolerance: ±10%; Voltage Rating: 50V; Temperature Coefficient: X7R; RoHS: Yes; ComponentLink1Description: Datasheet; ComponentLink1URL: https://wmsc.lcsc.com/wmsc/upload/file/pdf/v2/lcsc/2304140030_FH--Guangdong-Fenghua-Advanced-Tech-1206B473K500NT_C1870.pdf; ComponentLink2Description: JLCPCB Part URL; ComponentLink2URL: https://jlcpcb.com/partdetail/C1870; ComponentLink3Description: LCSC Part URL; ComponentLink3URL: https://lcsc.com/product-detail/Multilayer-Ceramic-Capacitors-MLCC---SMD-SMT_FH-Guangdong-Fenghua-Advanced-Tech-FH-Guangdong-Fenghua-Advanced-Tech-1206B473K500NT_C1870.html
footprint CAP-1206 (1206 (3216M) Capacitor)
pins: 1, 2

## 1206B473K501CT
designator C?  Capacitance: 47nF  (hidden comment: *)
Capacitor, Ceramic (MLCC), 47nF, ±10%, 500V, X7R, ±10%, SMD 1206; Manufacturer: Walsin Tech Corp; Manufacturer Part Number: 1206B473K501CT; Package Size: 1206; JLCPCB Basic Part: No; JLCPCB Part Number: C384732; Supplier 1: LCSC; Category: Capacitors - MLCC; Supplier Part Number 1: C384732; Tolerance: ±10%; Voltage Rating: 500V; Temperature Coefficient: X7R; RoHS: Yes; ComponentLink1Description: Datasheet; ComponentLink1URL: https://wmsc.lcsc.com/wmsc/upload/file/pdf/v2/lcsc/2304140030_Walsin-Tech-Corp-1206B473K501CT_C384732.pdf; ComponentLink2Description: JLCPCB Part URL; ComponentLink2URL: https://jlcpcb.com/partdetail/C384732; ComponentLink3Description: LCSC Part URL; ComponentLink3URL: https://lcsc.com/product-detail/Multilayer-Ceramic-Capacitors-MLCC---SMD-SMT_Walsin-Tech-Corp-Walsin-Tech-Corp-1206B473K501CT_C384732.html
footprint CAP-1206 (1206 (3216M) Capacitor)
pins: 1, 2

## 1206B473K501NT
designator C?  Capacitance: 47nF  (hidden comment: *)
Capacitor, Ceramic (MLCC), 47nF, ±10%, 500V, X7R, ±10%, SMD 1206; Manufacturer: FH(Guangdong Fenghua Advanced Tech); Manufacturer Part Number: 1206B473K501NT; Package Size: 1206; JLCPCB Basic Part: No; JLCPCB Part Number: C30322; Supplier 1: LCSC; Category: Capacitors - MLCC; Supplier Part Number 1: C30322; Tolerance: ±10%; Voltage Rating: 500V; Temperature Coefficient: X7R; RoHS: Yes; ComponentLink1Description: Datasheet; ComponentLink1URL: https://wmsc.lcsc.com/wmsc/upload/file/pdf/v2/lcsc/2304140030_FH--Guangdong-Fenghua-Advanced-Tech-1206B473K501NT_C30322.pdf; ComponentLink2Description: JLCPCB Part URL; ComponentLink2URL: https://jlcpcb.com/partdetail/C30322; ComponentLink3Description: LCSC Part URL; ComponentLink3URL: https://lcsc.com/product-detail/Multilayer-Ceramic-Capacitors-MLCC---SMD-SMT_FH-Guangdong-Fenghua-Advanced-Tech-FH-Guangdong-Fenghua-Advanced-Tech-1206B473K501NT_C30322.html
footprint CAP-1206 (1206 (3216M) Capacitor)
pins: 1, 2

## 1206B473K631CT
designator C?  Capacitance: 47nF  (hidden comment: *)
Capacitor, Ceramic (MLCC), 47nF, ±10%, 630V, X7R, ±10%, SMD 1206; Manufacturer: Walsin Tech Corp; Manufacturer Part Number: 1206B473K631CT; Package Size: 1206; JLCPCB Basic Part: No; JLCPCB Part Number: C303962; Supplier 1: LCSC; Category: Capacitors - MLCC; Supplier Part Number 1: C303962; Tolerance: ±10%; Voltage Rating: 630V; Temperature Coefficient: X7R; RoHS: Yes; ComponentLink1Description: Datasheet; ComponentLink1URL: https://wmsc.lcsc.com/wmsc/upload/file/pdf/v2/lcsc/2304231850_Walsin-Tech-Corp-1206B473K631CT_C303962.pdf; ComponentLink2Description: JLCPCB Part URL; ComponentLink2URL: https://jlcpcb.com/partdetail/C303962; ComponentLink3Description: LCSC Part URL; ComponentLink3URL: https://lcsc.com/product-detail/Multilayer-Ceramic-Capacitors-MLCC---SMD-SMT_Walsin-Tech-Corp-Walsin-Tech-Corp-1206B473K631CT_C303962.html
footprint CAP-1206 (1206 (3216M) Capacitor)
pins: 1, 2

## 1206B474K101CT
designator C?  Capacitance: 470nF  (hidden comment: *)
Capacitor, Ceramic (MLCC), 470nF, ±10%, 100V, X7R, ±10%, SMD 1206; Manufacturer: Walsin Tech Corp; Manufacturer Part Number: 1206B474K101CT; Package Size: 1206; JLCPCB Basic Part: No; JLCPCB Part Number: C384731; Supplier 1: LCSC; Category: Capacitors - MLCC; Supplier Part Number 1: C384731; Tolerance: ±10%; Voltage Rating: 100V; Temperature Coefficient: X7R; RoHS: Yes; ComponentLink1Description: Datasheet; ComponentLink1URL: https://wmsc.lcsc.com/wmsc/upload/file/pdf/v2/lcsc/2304140030_Walsin-Tech-Corp-1206B474K101CT_C384731.pdf; ComponentLink2Description: JLCPCB Part URL; ComponentLink2URL: https://jlcpcb.com/partdetail/C384731; ComponentLink3Description: LCSC Part URL; ComponentLink3URL: https://lcsc.com/product-detail/Multilayer-Ceramic-Capacitors-MLCC---SMD-SMT_Walsin-Tech-Corp-Walsin-Tech-Corp-1206B474K101CT_C384731.html
footprint CAP-1206 (1206 (3216M) Capacitor)
pins: 1, 2
